# Altium footprint library Connector.PcbLib: 536 footprints (part 28 of 34)
Each footprint in its own frame and in the unit in brackets; x right, y up, seen from the top. Pads: shape width x height; smd on the part's side, far side on the other; paste and mask are expansions set on the pad; w line width, h text height; cw(c..) or ccw(c..) is an arc to the next point about the centre after c.
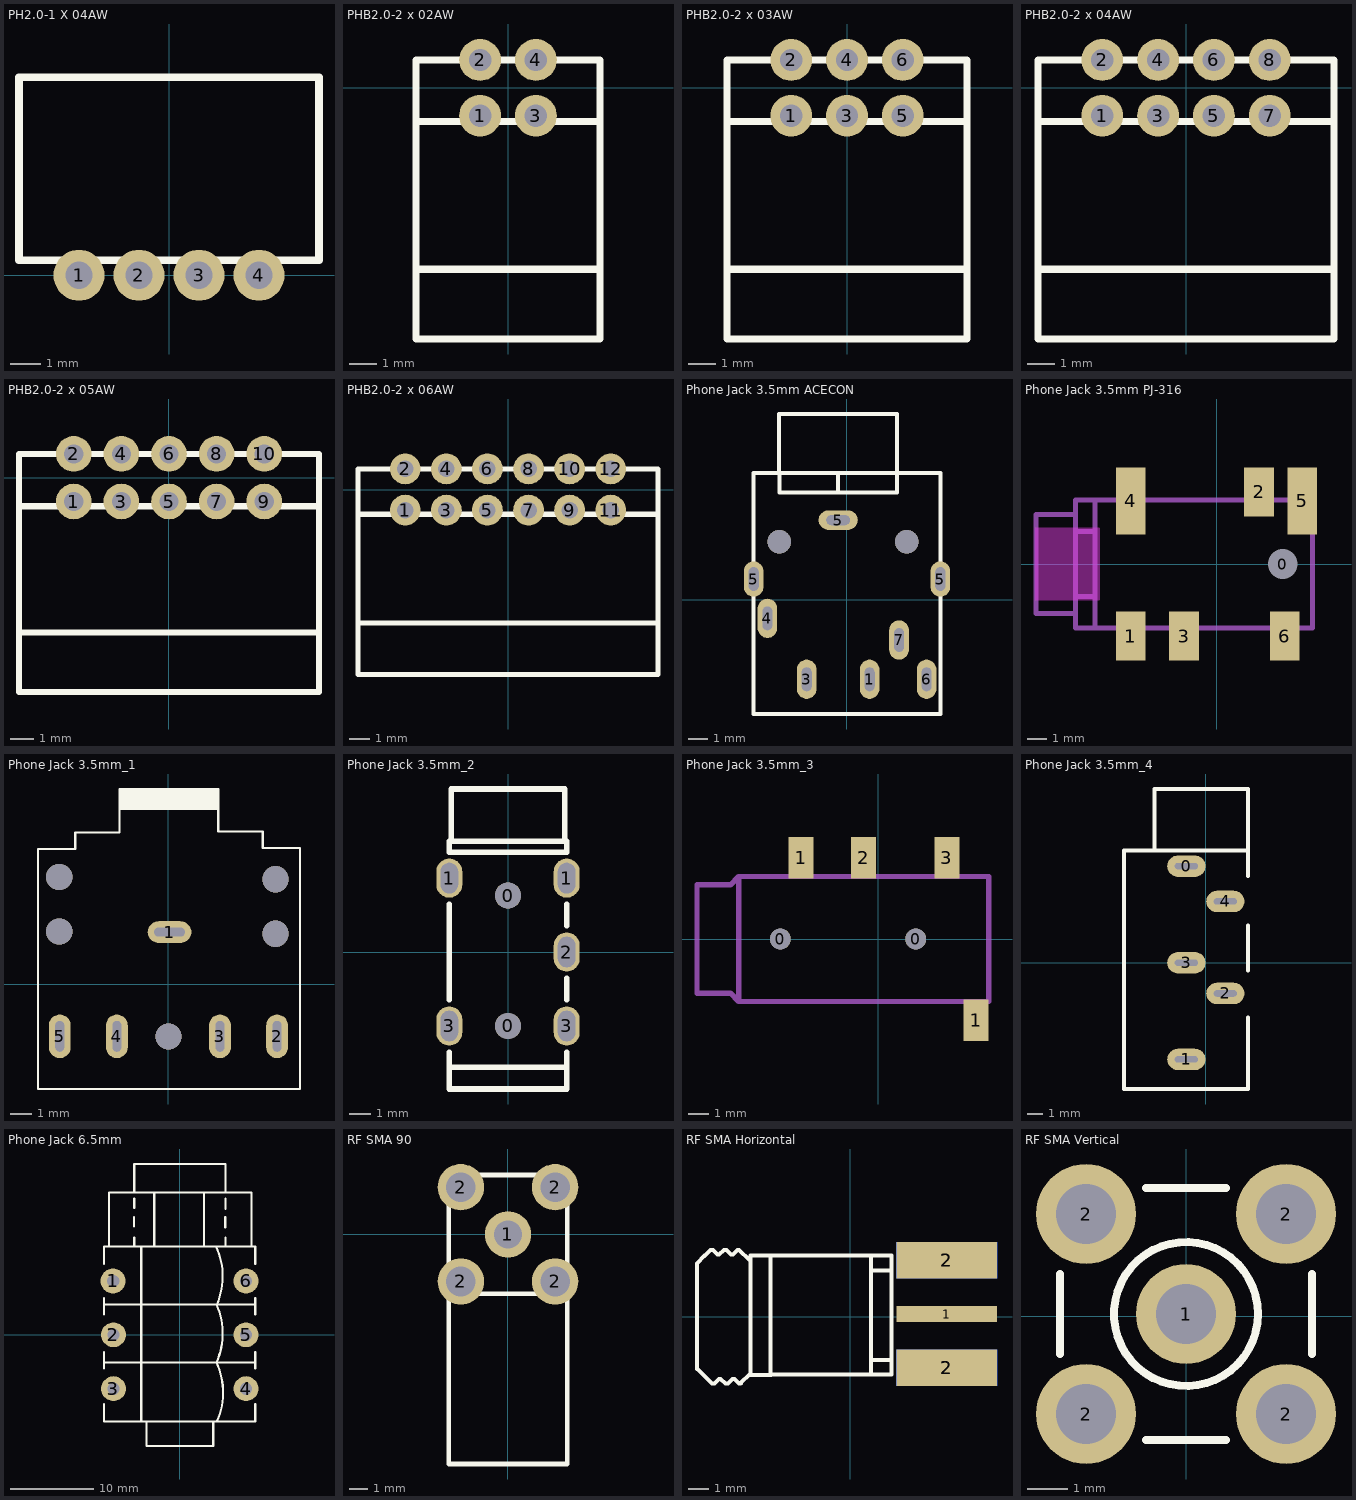
[diagram p27: the footprints below, top view; thin cyan lines are the x and y axes]

## PH2.0-1 X 04AW [mm]
pads (4):
  round 1.7 hole 0.9: 1(-3,0) 2(-1,0) 3(1,0) 4(3,0)
Top Overlay:
  lines w0.254: -5,0.5 -5,6.6 5,6.6 5,0.5 -5,0.5
3D body: height 3, standoff 2.3, extent 2.746,-0.254 3.254,1.067
3D body: height 3, standoff 2.3, extent 0.746,-0.254 1.254,1.067
3D body: height 3, standoff 2.3, extent -1.254,-0.254 -0.746,1.067
3D body: height 3, standoff -3.4, extent 2.746,-0.254 3.254,0.254
3D body: height 3, standoff -3.4, extent 0.746,-0.254 1.254,0.254
3D body: height 3, standoff -3.4, extent -1.254,-0.254 -0.746,0.254
3D body: height 3, standoff -3.4, extent -3.254,-0.254 -2.746,0.254
3D body: height 3, standoff 2.3, extent -3.254,-0.254 -2.746,1.067
3D body: height 4.9, standoff 0.1, extent -5,0.5 5,6.6

## PHB2.0-2 x 02AW [mm]
pads (4):
  round 1.5 hole 0.8: 1(-1,-1) 2(-1,1) 3(1,-1) 4(1,1)
Top Overlay:
  lines w0.254: -3.3,-6.5 3.3,-6.5 ; -3.3,-1.2 3.3,-1.2 ; -3.3,-9 3.3,-9 3.3,1 -3.3,1 -3.3,-9
3D body: height 9.9, standoff 0, extent -3.3,-9 3.3,1

## PHB2.0-2 x 03AW [mm]
pads (6):
  round 1.5 hole 0.8: 1(-2,-1) 2(-2,1) 3(0,-1) 4(0,1) 5(2,-1) 6(2,1)
Top Overlay:
  lines w0.254: -4.3,-6.5 4.3,-6.5 ; -4.3,-1.2 4.3,-1.2 ; -4.3,-9 4.3,-9 4.3,1 -4.3,1 -4.3,-9
3D body: height 9.9, standoff 0, extent -4.3,-9 4.3,1

## PHB2.0-2 x 04AW [mm]
pads (8):
  round 1.5 hole 0.8: 1(-3,-1) 2(-3,1) 3(-1,-1) 4(-1,1) 5(1,-1) 6(1,1) 7(3,-1) 8(3,1)
Top Overlay:
  lines w0.254: -5.3,-6.5 5.3,-6.5 ; -5.3,-1.2 5.3,-1.2 ; -5.3,-9 -5.3,1 5.3,1 5.3,-9 -5.3,-9
3D body: height 9.9, standoff 0, extent -5.3,-9 5.3,1

## PHB2.0-2 x 05AW [mm]
pads (10):
  round 1.5 hole 0.8: 1(-4,-1) 2(-4,1) 3(-2,-1) 4(-2,1) 5(0,-1) 6(0,1) 7(2,-1) 8(2,1) 9(4,-1) 10(4,1)
Top Overlay:
  lines w0.254: -6.3,-6.5 6.3,-6.5 ; -6.3,-1.2 6.3,-1.2 ; -6.3,-9 -6.3,1 6.3,1 6.3,-9 -6.3,-9
3D body: height 9.9, standoff 0, extent -6.3,-9 6.3,1

## PHB2.0-2 x 06AW [mm]
pads (12):
  round 1.5 hole 0.8: 1(-5,-1) 2(-5,1) 3(-3,-1) 4(-3,1) 5(-1,-1) 6(-1,1) 7(1,-1) 8(1,1) 9(3,-1) 10(3,1) 11(5,-1) 12(5,1)
Top Overlay:
  lines w0.254: -7.3,-6.5 7.3,-6.5 ; -7.3,-1.2 7.3,-1.2 ; -7.3,-9 7.3,-9 7.3,1 -7.3,1 -7.3,-9
3D body: height 9.9, standoff 0, extent -7.3,-9 7.3,1

## Phone Jack 3.5mm ACECON [mm]
pads (8):
  oval 1x2 hole 0.5 slot 1.2 at 90 deg: 1(1.15,-4.05) 3(-2.05,-4.05) 4(-4.05,-0.95) 6(4.05,-4.05) 7(2.65,-2.05)
  oval 1x1.8 hole 0.5 slot 1.2 at 90 deg: 5(-4.75,1.05) 5(4.75,1.05)
  oval 2x1 hole 0.5 slot 1.2 at 0 deg: 5(-0.45,4.05)
via 3.05,2.95 diameter 1.2 hole 1.2
via -3.45,2.95 diameter 1.2 hole 1.2
Top Overlay:
  lines w0.203: -0.45,5.45 -0.45,6.45 ; 2.522,6.45 2.55,6.45 ; 2.55,6.45 2.55,5.45 -3.447,5.45 -3.447,6.45 -3.45,6.45 -3.45,9.45 2.55,9.45 2.55,6.45 ; -4.75,-5.818 -4.75,6.45 4.75,6.45 4.75,-5.818 -4.75,-5.818
3D body: height 4.75, standoff 0, extent -4.768,-5.742 4.732,6.526
3D body: height 5.5, standoff -0.5, extent -3.473,5.542 2.526,9.542
3D body: height 4.3, standoff 0.7, extent -2.272,5.574 1.328,9.574

## Phone Jack 3.5mm PJ-316 [mm] "贴片耳机插座"
pads (7):
  round 1 hole 1.5: 0(3.35,0)
  rect 1.5x2.5 smd: 1(-4.35,-3.65) 2(2.15,3.65) 3(-1.65,-3.65) 6(3.45,-3.65)
  rect 1.5x3.4 smd: 4(-4.35,3.2) 5(4.35,3.2)
Keep-Out Layer:
  board cut-out: -5.95,-1.8 -5.95,1.8 -9.15,1.8 -9.15,-1.8
Keep-Out Layer:
  lines w0.076: -9.15,-1.8 -9.15,1.8 -5.95,1.8 -5.95,-1.8 -9.15,-1.8
Mechanical 15:
  lines w0.254: -7.15,-2.5 -9.15,-2.5 -9.15,2.5 -7.15,2.5 ; -7.15,-1.65 -6.15,-1.65 ; -7.15,1.65 -6.15,1.65 ; -6.15,-3.25 -6.15,3.25 ; -7.15,-3.25 -7.15,3.25 4.85,3.25 4.85,-3.25 -7.15,-3.25
3D body: height 4.5, standoff -0.5, extent -9.15,-2.497 -7.15,2.497
3D body: height 0.5, standoff -0.5, extent -7.15,-1.6 -6.15,1.7
3D body: height 4, standoff 0, extent -7.15,-3.25 4.85,3.25

## Phone Jack 3.5mm_1 [mm] "常见3.5mm双通道耳机插座"
pads (5):
  oval 2x1 hole 0.4 slot 1.4 at 0 deg: 1(0.051,2.388)
  oval 1x2 hole 0.4 slot 1.4 at 90 deg: 2(4.978,-2.388) 3(2.362,-2.388) 4(-2.362,-2.388) 5(-4.978,-2.388)
via 0,-2.389 diameter 1.2 hole 1.2
via -5,4.911 diameter 1.2 hole 1.2
via -5,2.411 diameter 1.2 hole 1.2
via 4.9,4.811 diameter 1.2 hole 1.2
via 4.9,2.311 diameter 1.2 hole 1.2
Top Overlay:
  rectangle: -2.237,7.994 2.286,8.945
  lines w0.1: 6.018,6.248 4.318,6.248 4.318,6.994 2.286,6.994 2.286,7.994 2.286,8.945 -2.237,8.945 -2.237,7.945 -2.237,6.945 -4.269,6.945 -4.269,6.199 -5.969,6.199 -5.969,-4.801 6.031,-4.801 6.031,6.199
3D body "sj1-3525n.STEP": height 5.75, standoff -3.05, extent -5.987,-4.98 6.013,9.02

## Phone Jack 3.5mm_2 [mm] "常见3段立体声耳机插座"
height 5
pads (7):
  round 1.2 hole 1.2 unplated: 0(0,-3.4) 0(0,2.6)
  oval 1.2x1.8 hole 0.8 slot 1.4 at 90 deg unplated: 1(-2.7,3.4) 1(2.7,3.4) 2(2.7,0) 3(-2.7,-3.4) 3(2.7,-3.4)
Top Overlay:
  lines w0.254: -2.7,-5.3 2.7,-5.3 ; -2.7,-4.6 -2.7,-6.3 2.7,-6.3 2.7,-4.6 ; -2.7,-2.2 -2.7,2.2 ; -2.6,5.1 -2.6,7.5 2.6,7.5 2.6,5.1 ; 2.7,-2.2 2.7,-1.2 ; 2.7,1.2 2.7,2.2 ; -2.7,4.6 -2.7,5.1 2.7,5.1 2.7,4.6 -2.7,4.6

## Phone Jack 3.5mm_3 [mm] "贴片耳机插座"
pads (6):
  round 1 hole 1: 0(-4.7,0) 0(1.8,0)
  rect 1.2x2 smd: 1(-3.7,3.9) 1(4.7,-3.9) 2(-0.7,3.9) 3(3.3,3.9)
Mechanical 15:
  lines w0.254: -6.7,-3 -6.7,3 ; -6.7,-3 5.3,-3 5.3,3 -6.7,3 ; -6.7,-3 -7.1,-2.6 -8.7,-2.6 -8.7,2.6 -7.1,2.6 -6.7,3
3D body "audio_buchse.STEP": height 4.06, standoff -0.01, extent -6.975,-3.565 4.995,3.769

## Phone Jack 3.5mm_4 [mm] "3.5mm三段式耳机插座"
pads (5):
  oval 2.5x1.4 hole 0.4 slot 1.5 at 0 deg: 0(-1.27,6.3) 1(-1.27,-6.3) 2(1.27,-2) 3(-1.27,0) 4(1.27,4)
Top Overlay:
  lines w0.254: -3.353,7.316 -3.353,11.329 2.743,11.329 2.743,7.316 ; 2.743,-3.555 2.743,-8.229 -5.334,-8.229 -5.334,7.316 2.743,7.316 ; 2.743,-0.507 2.743,2.439 ; 2.743,5.64 2.743,7.316
3D body "sj-3598.stp": height 13.3, standoff -2.5, extent -5.385,-6.793 2.915,11.57

## Phone Jack 6.5mm [mm]
pads (6):
  round 3 hole 1.5: 1(-8.025,6.5) 2(-7.975,0) 3(-7.975,-6.5) 4(8.025,-6.5) 5(8.025,0) 6(8.025,6.5)
Top Overlay:
  lines w0.254: -9.143,-8.384 -9.143,-10.467 9.145,-10.467 9.145,-8.384 ; -9.143,-4.035 -9.143,-2.085 ; -9.143,-3.355 9.094,-3.355 ; -9.143,2.468 -9.143,4.417 ; -9.143,3.655 9.145,3.655 ; -9.143,8.583 -9.143,10.666 9.145,10.666 9.145,8.583 ; -8.533,10.716 -8.533,17.168 8.688,17.168 8.688,10.666 ; -5.485,13.065 -5.485,14.222 ; -5.462,10.666 -5.462,11.732 ; -5.462,15.3 -5.462,16.457 ; -5.462,17.168 -5.462,20.622 5.538,20.622 5.538,17.168 ; -4.622,-10.467 -4.622,10.666 ; -4.012,-10.518 -4.012,-13.414 4.065,-13.414 4.065,-10.467 ; -3.047,10.716 -3.047,17.168 ; 2.947,10.666 2.947,17.168 ; 4.416,10.664 cw(c-3.434,7.062) 4.506,3.662 ; 4.451,-3.346 ccw(c-3.431,0.185) 4.485,3.639 ; 4.46,-3.342 cw(c-3.383,-6.958) 4.528,-10.425 ; 5.515,12.965 5.515,14.222 ; 5.538,10.666 5.538,11.732 ; 5.538,15.2 5.538,16.457 ; 9.145,-4.035 9.145,-2.085 ; 9.145,2.468 9.145,4.417
3D body "Audio Jack Neutrik Amphenol 6.35.STEP": height 16.3, standoff -3.64, extent -9.08,-13.131 9.12,18.663

## RF SMA 90 [mm]
pads (5):
  round 2.5 hole 1.5: 1(0,0)
  round 2.5 hole 1.6: 2(-2.54,2.54) 2(-2.54,-2.54) 2(2.54,2.54) 2(2.54,-2.54)
Top Overlay:
  lines w0.254: -3.2,-3.2 3.2,-3.2 ; -3.2,-12.375 -3.2,3.2 3.2,3.2 3.2,-12.375 -3.2,-12.375
3D body "90° 3-1478978-0.stp": height 10.1, standoff -3.4, extent -3.175,-12.375 3.175,3.175

## RF SMA Horizontal [mm]
pads (5):
  rect 5x0.8 smd: 1(4.775,0.127)
  rect 5x1.8 smd: 2(4.775,-2.54) 2(4.775,2.794)
  rect 5x1.8 smd far side: 2(4.775,-2.54) 2(4.775,2.794)
Top Overlay:
  lines w0.2: -7.62,-2.603 -7.62,2.646 -7.239,3.027 ; -7.595,-2.603 -7.204,-2.993 ; -7.255,3.001 -6.95,3.306 -6.823,3.306 -6.595,3.078 -6.518,3.078 -6.29,3.306 -6.163,3.306 -5.934,3.078 -5.833,3.078 -5.6,3.31 -5.524,3.31 -5.024,2.81 ; -7.179,-3.018 -6.874,-3.323 -6.747,-3.323 -6.518,-3.095 -6.442,-3.095 -6.214,-3.323 -6.087,-3.323 -5.858,-3.095 -5.756,-3.095 -5.524,-3.327 -5.448,-3.327 ; -5.473,-3.327 -4.973,-2.827 ; -4.973,-2.891 -4.973,3.023 -3.973,3.023 -3.973,-2.891 ; -4.948,-2.891 -3.948,-2.891 ; -3.973,3.027 1.027,3.027 ; -3.948,-2.866 1.052,-2.866 2.027,-2.866 2.027,2.098 2.027,3.027 1.027,3.027 ; 1.027,-2.866 1.027,3.027 ; 1.027,-2.159 2.027,-2.159 ; 1.027,2.294 2.027,2.294
3D body "User Library-620-SMA-02-112-TGG SMA Female for PCB edge Mount.step": height 3.66, standoff -2.38, extent -7.39,-2.873 6.21,3.127

## RF SMA Vertical [mm]
pads (5):
  round 2.5 hole 1.5: 1(0,0.051) 2(-2.5,-2.449) 2(-2.5,2.551) 2(2.5,-2.449) 2(2.5,2.551)
Top Overlay:
  circle w0.2: c0,0.051 r1.8
  lines w0.2: -3.15,-0.949 -3.15,1.051 ; -1,-3.099 1,-3.099 ; -1,3.201 1,3.201 ; 3.15,-0.949 3.15,1.051
Mechanical 1:
  circle w0.025: c0,0.051 r1.8
  circle w0.025: c0,0.051 r1.05
  circle w0.025: c0,0.051 r0.2
3D body "User Library-SMA_Stehend_Amp 132134RP-1.STEP": height 9.53, standoff -3.94, extent -3.474,-3.373 3.526,3.627